# Altium schematic symbol library jlcpcb_2025_04_capacitors_extended_0402.schlib: 3594 symbols (part 4 of 20) (continued)
## AC0402CRNPO9BN1R5
designator C?  Capacitance: 1.5pF  (hidden comment: *)
Capacitor, Ceramic (MLCC), 1.5pF, 50V, NP0, SMD 0402; Manufacturer: YAGEO; Manufacturer Part Number: AC0402CRNPO9BN1R5; Package Size: 0402; JLCPCB Basic Part: No; JLCPCB Part Number: C726105; Supplier 1: LCSC; Category: Capacitors - MLCC; Supplier Part Number 1: C726105; Voltage Rating: 50V; Temperature Coefficient: NP0; RoHS: Yes; ComponentLink1Description: Datasheet; ComponentLink1URL: https://wmsc.lcsc.com/wmsc/upload/file/pdf/v2/lcsc/2010041434_YAGEO-AC0402CRNPO9BN1R5_C726105.pdf; ComponentLink2Description: JLCPCB Part URL; ComponentLink2URL: https://jlcpcb.com/partdetail/C726105; ComponentLink3Description: LCSC Part URL; ComponentLink3URL: https://lcsc.com/product-detail/Multilayer-Ceramic-Capacitors-MLCC---SMD-SMT_YAGEO-YAGEO-AC0402CRNPO9BN1R5_C726105.html
footprint CAP-0402 (0402 (1005M) Capacitor)
pins: 1, 2

## AC0402CRNPO9BN1R8
designator C?  Capacitance: 1.8pF  (hidden comment: *)
Capacitor, Ceramic (MLCC), 1.8pF, 50V, NP0, SMD 0402; Manufacturer: YAGEO; Manufacturer Part Number: AC0402CRNPO9BN1R8; Package Size: 0402; JLCPCB Basic Part: No; JLCPCB Part Number: C723500; Supplier 1: LCSC; Category: Capacitors - MLCC; Supplier Part Number 1: C723500; Voltage Rating: 50V; Temperature Coefficient: NP0; RoHS: Yes; ComponentLink1Description: Datasheet; ComponentLink1URL: https://wmsc.lcsc.com/wmsc/upload/file/pdf/v2/lcsc/2008171812_YAGEO-AC0402CRNPO9BN1R8_C723500.pdf; ComponentLink2Description: JLCPCB Part URL; ComponentLink2URL: https://jlcpcb.com/partdetail/C723500; ComponentLink3Description: LCSC Part URL; ComponentLink3URL: https://lcsc.com/product-detail/Multilayer-Ceramic-Capacitors-MLCC---SMD-SMT_YAGEO-YAGEO-AC0402CRNPO9BN1R8_C723500.html
footprint CAP-0402 (0402 (1005M) Capacitor)
pins: 1, 2

## AC0402CRNPO9BN2R0
designator C?  Capacitance: 2pF  (hidden comment: *)
Capacitor, Ceramic (MLCC), 2pF, 50V, NP0, SMD 0402; Manufacturer: YAGEO; Manufacturer Part Number: AC0402CRNPO9BN2R0; Package Size: 0402; JLCPCB Basic Part: No; JLCPCB Part Number: C726106; Supplier 1: LCSC; Category: Capacitors - MLCC; Supplier Part Number 1: C726106; Voltage Rating: 50V; Temperature Coefficient: NP0; RoHS: Yes; ComponentLink1Description: Datasheet; ComponentLink1URL: https://wmsc.lcsc.com/wmsc/upload/file/pdf/v2/lcsc/2010041434_YAGEO-AC0402CRNPO9BN2R0_C726106.pdf; ComponentLink2Description: JLCPCB Part URL; ComponentLink2URL: https://jlcpcb.com/partdetail/C726106; ComponentLink3Description: LCSC Part URL; ComponentLink3URL: https://lcsc.com/product-detail/Multilayer-Ceramic-Capacitors-MLCC---SMD-SMT_YAGEO-YAGEO-AC0402CRNPO9BN2R0_C726106.html
footprint CAP-0402 (0402 (1005M) Capacitor)
pins: 1, 2

## AC0402CRNPO9BN2R2
designator C?  Capacitance: 2.2pF  (hidden comment: *)
Capacitor, Ceramic (MLCC), 2.2pF, 50V, NP0, SMD 0402; Manufacturer: YAGEO; Manufacturer Part Number: AC0402CRNPO9BN2R2; Package Size: 0402; JLCPCB Basic Part: No; JLCPCB Part Number: C726107; Supplier 1: LCSC; Category: Capacitors - MLCC; Supplier Part Number 1: C726107; Voltage Rating: 50V; Temperature Coefficient: NP0; RoHS: Yes; ComponentLink1Description: Datasheet; ComponentLink1URL: https://wmsc.lcsc.com/wmsc/upload/file/pdf/v2/lcsc/2011221205_YAGEO-AC0402CRNPO9BN2R2_C726107.pdf; ComponentLink2Description: JLCPCB Part URL; ComponentLink2URL: https://jlcpcb.com/partdetail/C726107; ComponentLink3Description: LCSC Part URL; ComponentLink3URL: https://lcsc.com/product-detail/Multilayer-Ceramic-Capacitors-MLCC---SMD-SMT_YAGEO-YAGEO-AC0402CRNPO9BN2R2_C726107.html
footprint CAP-0402 (0402 (1005M) Capacitor)
pins: 1, 2

## AC0402CRNPO9BN2R7
designator C?  Capacitance: 2.7pF  (hidden comment: *)
Capacitor, Ceramic (MLCC), 2.7pF, 50V, NP0, SMD 0402; Manufacturer: YAGEO; Manufacturer Part Number: AC0402CRNPO9BN2R7; Package Size: 0402; JLCPCB Basic Part: No; JLCPCB Part Number: C726108; Supplier 1: LCSC; Category: Capacitors - MLCC; Supplier Part Number 1: C726108; Voltage Rating: 50V; Temperature Coefficient: NP0; RoHS: Yes; ComponentLink1Description: Datasheet; ComponentLink1URL: https://wmsc.lcsc.com/wmsc/upload/file/pdf/v2/lcsc/2009191609_YAGEO-AC0402CRNPO9BN2R7_C726108.pdf; ComponentLink2Description: JLCPCB Part URL; ComponentLink2URL: https://jlcpcb.com/partdetail/C726108; ComponentLink3Description: LCSC Part URL; ComponentLink3URL: https://lcsc.com/product-detail/Multilayer-Ceramic-Capacitors-MLCC---SMD-SMT_YAGEO-YAGEO-AC0402CRNPO9BN2R7_C726108.html
footprint CAP-0402 (0402 (1005M) Capacitor)
pins: 1, 2

## AC0402CRNPO9BN3R0
designator C?  Capacitance: 3pF  (hidden comment: *)
Capacitor, Ceramic (MLCC), 3pF, 50V, NP0, SMD 0402; Manufacturer: YAGEO; Manufacturer Part Number: AC0402CRNPO9BN3R0; Package Size: 0402; JLCPCB Basic Part: No; JLCPCB Part Number: C726109; Supplier 1: LCSC; Category: Capacitors - MLCC; Supplier Part Number 1: C726109; Voltage Rating: 50V; Temperature Coefficient: NP0; RoHS: Yes; ComponentLink1Description: Datasheet; ComponentLink1URL: https://wmsc.lcsc.com/wmsc/upload/file/pdf/v2/lcsc/2010311304_YAGEO-AC0402CRNPO9BN3R0_C726109.pdf; ComponentLink2Description: JLCPCB Part URL; ComponentLink2URL: https://jlcpcb.com/partdetail/C726109; ComponentLink3Description: LCSC Part URL; ComponentLink3URL: https://lcsc.com/product-detail/Multilayer-Ceramic-Capacitors-MLCC---SMD-SMT_YAGEO-YAGEO-AC0402CRNPO9BN3R0_C726109.html
footprint CAP-0402 (0402 (1005M) Capacitor)
pins: 1, 2

## AC0402CRNPO9BN3R3
designator C?  Capacitance: 3.3pF  (hidden comment: *)
Capacitor, Ceramic (MLCC), 3.3pF, 50V, NP0, SMD 0402; Manufacturer: YAGEO; Manufacturer Part Number: AC0402CRNPO9BN3R3; Package Size: 0402; JLCPCB Basic Part: No; JLCPCB Part Number: C326841; Supplier 1: LCSC; Category: Capacitors - MLCC; Supplier Part Number 1: C326841; Voltage Rating: 50V; Temperature Coefficient: NP0; RoHS: Yes; ComponentLink1Description: Datasheet; ComponentLink1URL: https://wmsc.lcsc.com/wmsc/upload/file/pdf/v2/lcsc/1811151648_YAGEO-AC0402CRNPO9BN3R3_C326841.pdf; ComponentLink2Description: JLCPCB Part URL; ComponentLink2URL: https://jlcpcb.com/partdetail/C326841; ComponentLink3Description: LCSC Part URL; ComponentLink3URL: https://lcsc.com/product-detail/Multilayer-Ceramic-Capacitors-MLCC---SMD-SMT_YAGEO-YAGEO-AC0402CRNPO9BN3R3_C326841.html
footprint CAP-0402 (0402 (1005M) Capacitor)
pins: 1, 2

## AC0402CRNPO9BN3R9
designator C?  Capacitance: 3.9pF  (hidden comment: *)
Capacitor, Ceramic (MLCC), 3.9pF, 50V, NP0, SMD 0402; Manufacturer: YAGEO; Manufacturer Part Number: AC0402CRNPO9BN3R9; Package Size: 0402; JLCPCB Basic Part: No; JLCPCB Part Number: C726110; Supplier 1: LCSC; Category: Capacitors - MLCC; Supplier Part Number 1: C726110; Voltage Rating: 50V; Temperature Coefficient: NP0; RoHS: Yes; ComponentLink1Description: Datasheet; ComponentLink1URL: https://wmsc.lcsc.com/wmsc/upload/file/pdf/v2/lcsc/2010041434_YAGEO-AC0402CRNPO9BN3R9_C726110.pdf; ComponentLink2Description: JLCPCB Part URL; ComponentLink2URL: https://jlcpcb.com/partdetail/C726110; ComponentLink3Description: LCSC Part URL; ComponentLink3URL: https://lcsc.com/product-detail/Multilayer-Ceramic-Capacitors-MLCC---SMD-SMT_YAGEO-YAGEO-AC0402CRNPO9BN3R9_C726110.html
footprint CAP-0402 (0402 (1005M) Capacitor)
pins: 1, 2

## AC0402CRNPO9BN4R0
designator C?  Capacitance: 4pF  (hidden comment: *)
Capacitor, Ceramic (MLCC), 4pF, 50V, NP0, SMD 0402; Manufacturer: YAGEO; Manufacturer Part Number: AC0402CRNPO9BN4R0; Package Size: 0402; JLCPCB Basic Part: No; JLCPCB Part Number: C726111; Supplier 1: LCSC; Category: Capacitors - MLCC; Supplier Part Number 1: C726111; Voltage Rating: 50V; Temperature Coefficient: NP0; RoHS: Yes; ComponentLink1Description: Datasheet; ComponentLink1URL: https://wmsc.lcsc.com/wmsc/upload/file/pdf/v2/lcsc/2203261130_YAGEO-AC0402CRNPO9BN4R0_C726111.pdf; ComponentLink2Description: JLCPCB Part URL; ComponentLink2URL: https://jlcpcb.com/partdetail/C726111; ComponentLink3Description: LCSC Part URL; ComponentLink3URL: https://lcsc.com/product-detail/Multilayer-Ceramic-Capacitors-MLCC---SMD-SMT_YAGEO-YAGEO-AC0402CRNPO9BN4R0_C726111.html
footprint CAP-0402 (0402 (1005M) Capacitor)
pins: 1, 2

## AC0402CRNPO9BN4R7
designator C?  Capacitance: 4.7pF  (hidden comment: *)
Capacitor, Ceramic (MLCC), 4.7pF, 50V, NP0, SMD 0402; Manufacturer: YAGEO; Manufacturer Part Number: AC0402CRNPO9BN4R7; Package Size: 0402; JLCPCB Basic Part: No; JLCPCB Part Number: C726112; Supplier 1: LCSC; Category: Capacitors - MLCC; Supplier Part Number 1: C726112; Voltage Rating: 50V; Temperature Coefficient: NP0; RoHS: Yes; ComponentLink1Description: Datasheet; ComponentLink1URL: https://wmsc.lcsc.com/wmsc/upload/file/pdf/v2/lcsc/2009181006_YAGEO-AC0402CRNPO9BN4R7_C726112.pdf; ComponentLink2Description: JLCPCB Part URL; ComponentLink2URL: https://jlcpcb.com/partdetail/C726112; ComponentLink3Description: LCSC Part URL; ComponentLink3URL: https://lcsc.com/product-detail/Multilayer-Ceramic-Capacitors-MLCC---SMD-SMT_YAGEO-YAGEO-AC0402CRNPO9BN4R7_C726112.html
footprint CAP-0402 (0402 (1005M) Capacitor)
pins: 1, 2

## AC0402CRNPO9BN5R0
designator C?  Capacitance: 5pF  (hidden comment: *)
Capacitor, Ceramic (MLCC), 5pF, 50V, NP0, SMD 0402; Manufacturer: YAGEO; Manufacturer Part Number: AC0402CRNPO9BN5R0; Package Size: 0402; JLCPCB Basic Part: No; JLCPCB Part Number: C726113; Supplier 1: LCSC; Category: Capacitors - MLCC; Supplier Part Number 1: C726113; Voltage Rating: 50V; Temperature Coefficient: NP0; RoHS: Yes; ComponentLink1Description: Datasheet; ComponentLink1URL: https://wmsc.lcsc.com/wmsc/upload/file/pdf/v2/lcsc/2009181006_YAGEO-AC0402CRNPO9BN5R0_C726113.pdf; ComponentLink2Description: JLCPCB Part URL; ComponentLink2URL: https://jlcpcb.com/partdetail/C726113; ComponentLink3Description: LCSC Part URL; ComponentLink3URL: https://lcsc.com/product-detail/Multilayer-Ceramic-Capacitors-MLCC---SMD-SMT_YAGEO-YAGEO-AC0402CRNPO9BN5R0_C726113.html
footprint CAP-0402 (0402 (1005M) Capacitor)
pins: 1, 2

## AC0402CRNPO9BN5R6
designator C?  Capacitance: 5.6pF  (hidden comment: *)
Capacitor, Ceramic (MLCC), 5.6pF, 50V, NP0, SMD 0402; Manufacturer: YAGEO; Manufacturer Part Number: AC0402CRNPO9BN5R6; Package Size: 0402; JLCPCB Basic Part: No; JLCPCB Part Number: C2168879; Supplier 1: LCSC; Category: Capacitors - MLCC; Supplier Part Number 1: C2168879; Voltage Rating: 50V; Temperature Coefficient: NP0; RoHS: Yes; ComponentLink1Description: Datasheet; ComponentLink1URL: https://wmsc.lcsc.com/wmsc/upload/file/pdf/v2/lcsc/2202040330_YAGEO-AC0402CRNPO9BN5R6_C2168879.pdf; ComponentLink2Description: JLCPCB Part URL; ComponentLink2URL: https://jlcpcb.com/partdetail/C2168879; ComponentLink3Description: LCSC Part URL; ComponentLink3URL: https://lcsc.com/product-detail/Multilayer-Ceramic-Capacitors-MLCC---SMD-SMT_YAGEO-YAGEO-AC0402CRNPO9BN5R6_C2168879.html
footprint CAP-0402 (0402 (1005M) Capacitor)
pins: 1, 2

## AC0402CRNPO9BN6R0
designator C?  Capacitance: 6pF  (hidden comment: *)
Capacitor, Ceramic (MLCC), 6pF, 50V, NP0, SMD 0402; Manufacturer: YAGEO; Manufacturer Part Number: AC0402CRNPO9BN6R0; Package Size: 0402; JLCPCB Basic Part: No; JLCPCB Part Number: C726114; Supplier 1: LCSC; Category: Capacitors - MLCC; Supplier Part Number 1: C726114; Voltage Rating: 50V; Temperature Coefficient: NP0; RoHS: Yes; ComponentLink1Description: Datasheet; ComponentLink1URL: https://wmsc.lcsc.com/wmsc/upload/file/pdf/v2/lcsc/2010311304_YAGEO-AC0402CRNPO9BN6R0_C726114.pdf; ComponentLink2Description: JLCPCB Part URL; ComponentLink2URL: https://jlcpcb.com/partdetail/C726114; ComponentLink3Description: LCSC Part URL; ComponentLink3URL: https://lcsc.com/product-detail/Multilayer-Ceramic-Capacitors-MLCC---SMD-SMT_YAGEO-YAGEO-AC0402CRNPO9BN6R0_C726114.html
footprint CAP-0402 (0402 (1005M) Capacitor)
pins: 1, 2

## AC0402CRNPO9BN6R8
designator C?  Capacitance: 6.8pF  (hidden comment: *)
Capacitor, Ceramic (MLCC), 6.8pF, 50V, NP0, SMD 0402; Manufacturer: YAGEO; Manufacturer Part Number: AC0402CRNPO9BN6R8; Package Size: 0402; JLCPCB Basic Part: No; JLCPCB Part Number: C726115; Supplier 1: LCSC; Category: Capacitors - MLCC; Supplier Part Number 1: C726115; Voltage Rating: 50V; Temperature Coefficient: NP0; RoHS: Yes; ComponentLink1Description: Datasheet; ComponentLink1URL: https://wmsc.lcsc.com/wmsc/upload/file/pdf/v2/lcsc/2009181006_YAGEO-AC0402CRNPO9BN6R8_C726115.pdf; ComponentLink2Description: JLCPCB Part URL; ComponentLink2URL: https://jlcpcb.com/partdetail/C726115; ComponentLink3Description: LCSC Part URL; ComponentLink3URL: https://lcsc.com/product-detail/Multilayer-Ceramic-Capacitors-MLCC---SMD-SMT_YAGEO-YAGEO-AC0402CRNPO9BN6R8_C726115.html
footprint CAP-0402 (0402 (1005M) Capacitor)
pins: 1, 2

## AC0402CRNPO9BN7R0
designator C?  Capacitance: 7pF  (hidden comment: *)
Capacitor, Ceramic (MLCC), 7pF, 50V, NP0, SMD 0402; Manufacturer: YAGEO; Manufacturer Part Number: AC0402CRNPO9BN7R0; Package Size: 0402; JLCPCB Basic Part: No; JLCPCB Part Number: C2187952; Supplier 1: LCSC; Category: Capacitors - MLCC; Supplier Part Number 1: C2187952; Voltage Rating: 50V; Temperature Coefficient: NP0; RoHS: Yes; ComponentLink1Description: Datasheet; ComponentLink1URL: https://wmsc.lcsc.com/wmsc/upload/file/pdf/v2/lcsc/2202041730_YAGEO-AC0402CRNPO9BN7R0_C2187952.pdf; ComponentLink2Description: JLCPCB Part URL; ComponentLink2URL: https://jlcpcb.com/partdetail/C2187952; ComponentLink3Description: LCSC Part URL; ComponentLink3URL: https://lcsc.com/product-detail/Multilayer-Ceramic-Capacitors-MLCC---SMD-SMT_YAGEO-YAGEO-AC0402CRNPO9BN7R0_C2187952.html
footprint CAP-0402 (0402 (1005M) Capacitor)
pins: 1, 2

## AC0402CRNPO9BN8R0
designator C?  Capacitance: 8pF  (hidden comment: *)
Capacitor, Ceramic (MLCC), 8pF, 50V, NP0, SMD 0402; Manufacturer: YAGEO; Manufacturer Part Number: AC0402CRNPO9BN8R0; Package Size: 0402; JLCPCB Basic Part: No; JLCPCB Part Number: C962144; Supplier 1: LCSC; Category: Capacitors - MLCC; Supplier Part Number 1: C962144; Voltage Rating: 50V; Temperature Coefficient: NP0; RoHS: Yes; ComponentLink1Description: Datasheet; ComponentLink1URL: https://wmsc.lcsc.com/wmsc/upload/file/pdf/v2/lcsc/2011291034_YAGEO-AC0402CRNPO9BN8R0_C962144.pdf; ComponentLink2Description: JLCPCB Part URL; ComponentLink2URL: https://jlcpcb.com/partdetail/C962144; ComponentLink3Description: LCSC Part URL; ComponentLink3URL: https://lcsc.com/product-detail/Multilayer-Ceramic-Capacitors-MLCC---SMD-SMT_YAGEO-YAGEO-AC0402CRNPO9BN8R0_C962144.html
footprint CAP-0402 (0402 (1005M) Capacitor)
pins: 1, 2

## AC0402CRNPO9BN8R2
designator C?  Capacitance: 8.2pF  (hidden comment: *)
Capacitor, Ceramic (MLCC), 8.2pF, 50V, NP0, SMD 0402; Manufacturer: YAGEO; Manufacturer Part Number: AC0402CRNPO9BN8R2; Package Size: 0402; JLCPCB Basic Part: No; JLCPCB Part Number: C726117; Supplier 1: LCSC; Category: Capacitors - MLCC; Supplier Part Number 1: C726117; Voltage Rating: 50V; Temperature Coefficient: NP0; RoHS: Yes; ComponentLink1Description: Datasheet; ComponentLink1URL: https://wmsc.lcsc.com/wmsc/upload/file/pdf/v2/lcsc/2010041434_YAGEO-AC0402CRNPO9BN8R2_C726117.pdf; ComponentLink2Description: JLCPCB Part URL; ComponentLink2URL: https://jlcpcb.com/partdetail/C726117; ComponentLink3Description: LCSC Part URL; ComponentLink3URL: https://lcsc.com/product-detail/Multilayer-Ceramic-Capacitors-MLCC---SMD-SMT_YAGEO-YAGEO-AC0402CRNPO9BN8R2_C726117.html
footprint CAP-0402 (0402 (1005M) Capacitor)
pins: 1, 2

## AC0402CRNPO9BN9R0
designator C?  Capacitance: 9pF  (hidden comment: *)
Capacitor, Ceramic (MLCC), 9pF, 50V, NP0, SMD 0402; Manufacturer: YAGEO; Manufacturer Part Number: AC0402CRNPO9BN9R0; Package Size: 0402; JLCPCB Basic Part: No; JLCPCB Part Number: C326843; Supplier 1: LCSC; Category: Capacitors - MLCC; Supplier Part Number 1: C326843; Voltage Rating: 50V; Temperature Coefficient: NP0; RoHS: Yes; ComponentLink1Description: Datasheet; ComponentLink1URL: https://wmsc.lcsc.com/wmsc/upload/file/pdf/v2/lcsc/1811141353_YAGEO-AC0402CRNPO9BN9R0_C326843.pdf; ComponentLink2Description: JLCPCB Part URL; ComponentLink2URL: https://jlcpcb.com/partdetail/C326843; ComponentLink3Description: LCSC Part URL; ComponentLink3URL: https://lcsc.com/product-detail/Multilayer-Ceramic-Capacitors-MLCC---SMD-SMT_YAGEO-YAGEO-AC0402CRNPO9BN9R0_C326843.html
footprint CAP-0402 (0402 (1005M) Capacitor)
pins: 1, 2

## AC0402DRNPO9BN6R8
designator C?  Capacitance: 6.8pF  (hidden comment: *)
Capacitor, Ceramic (MLCC), 6.8pF, 50V, NP0, SMD 0402; Manufacturer: YAGEO; Manufacturer Part Number: AC0402DRNPO9BN6R8; Package Size: 0402; JLCPCB Basic Part: No; JLCPCB Part Number: C2180791; Supplier 1: LCSC; Category: Capacitors - MLCC; Supplier Part Number 1: C2180791; Voltage Rating: 50V; Temperature Coefficient: NP0; RoHS: Yes; ComponentLink1Description: Datasheet; ComponentLink1URL: https://wmsc.lcsc.com/wmsc/upload/file/pdf/v2/lcsc/2202041130_YAGEO-AC0402DRNPO9BN6R8_C2180791.pdf; ComponentLink2Description: JLCPCB Part URL; ComponentLink2URL: https://jlcpcb.com/partdetail/C2180791; ComponentLink3Description: LCSC Part URL; ComponentLink3URL: https://lcsc.com/product-detail/Multilayer-Ceramic-Capacitors-MLCC---SMD-SMT_YAGEO-YAGEO-AC0402DRNPO9BN6R8_C2180791.html
footprint CAP-0402 (0402 (1005M) Capacitor)
pins: 1, 2

## AC0402DRNPO9BN8R0
designator C?  Capacitance: 8pF  (hidden comment: *)
Capacitor, Ceramic (MLCC), 8pF, 50V, NP0, SMD 0402; Manufacturer: YAGEO; Manufacturer Part Number: AC0402DRNPO9BN8R0; Package Size: 0402; JLCPCB Basic Part: No; JLCPCB Part Number: C705009; Supplier 1: LCSC; Category: Capacitors - MLCC; Supplier Part Number 1: C705009; Voltage Rating: 50V; Temperature Coefficient: NP0; RoHS: Yes; ComponentLink1Description: Datasheet; ComponentLink1URL: https://wmsc.lcsc.com/wmsc/upload/file/pdf/v2/lcsc/2304140030_YAGEO-AC0402DRNPO9BN8R0_C705009.pdf; ComponentLink2Description: JLCPCB Part URL; ComponentLink2URL: https://jlcpcb.com/partdetail/C705009; ComponentLink3Description: LCSC Part URL; ComponentLink3URL: https://lcsc.com/product-detail/Multilayer-Ceramic-Capacitors-MLCC---SMD-SMT_YAGEO-YAGEO-AC0402DRNPO9BN8R0_C705009.html
footprint CAP-0402 (0402 (1005M) Capacitor)
pins: 1, 2

## AC0402FRNPO9BN100
designator C?  Capacitance: 10pF  (hidden comment: *)
Capacitor, Ceramic (MLCC), 10pF, ±1%, 50V, C0G, ±1%, SMD 0402; Manufacturer: YAGEO; Manufacturer Part Number: AC0402FRNPO9BN100; Package Size: 0402; JLCPCB Basic Part: No; JLCPCB Part Number: C3864989; Supplier 1: LCSC; Category: Capacitors - MLCC; Supplier Part Number 1: C3864989; Tolerance: ±1%; Voltage Rating: 50V; Temperature Coefficient: C0G; RoHS: Yes; ComponentLink1Description: Datasheet; ComponentLink1URL: https://wmsc.lcsc.com/wmsc/upload/file/pdf/v2/lcsc/2401221317_YAGEO-AC0402FRNPO9BN100_C3864989.pdf; ComponentLink2Description: JLCPCB Part URL; ComponentLink2URL: https://jlcpcb.com/partdetail/C3864989; ComponentLink3Description: LCSC Part URL; ComponentLink3URL: https://lcsc.com/product-detail/Multilayer-Ceramic-Capacitors-MLCC---SMD-SMT_YAGEO-YAGEO-AC0402FRNPO9BN100_C3864989.html
footprint CAP-0402 (0402 (1005M) Capacitor)
pins: 1, 2

## AC0402FRNPO9BN120
designator C?  Capacitance: 12pF  (hidden comment: *)
Capacitor, Ceramic (MLCC), 12pF, ±1%, 50V, C0G, ±1%, SMD 0402; Manufacturer: YAGEO; Manufacturer Part Number: AC0402FRNPO9BN120; Package Size: 0402; JLCPCB Basic Part: No; JLCPCB Part Number: C3857072; Supplier 1: LCSC; Category: Capacitors - MLCC; Supplier Part Number 1: C3857072; Tolerance: ±1%; Voltage Rating: 50V; Temperature Coefficient: C0G; RoHS: Yes; ComponentLink1Description: Datasheet; ComponentLink1URL: https://wmsc.lcsc.com/wmsc/upload/file/pdf/v2/lcsc/2311211113_YAGEO-AC0402FRNPO9BN120_C3857072.pdf; ComponentLink2Description: JLCPCB Part URL; ComponentLink2URL: https://jlcpcb.com/partdetail/C3857072; ComponentLink3Description: LCSC Part URL; ComponentLink3URL: https://lcsc.com/product-detail/Multilayer-Ceramic-Capacitors-MLCC---SMD-SMT_YAGEO-YAGEO-AC0402FRNPO9BN120_C3857072.html
footprint CAP-0402 (0402 (1005M) Capacitor)
pins: 1, 2

## AC0402FRNPO9BN470
designator C?  Capacitance: 47pF  (hidden comment: *)
Capacitor, Ceramic (MLCC), 47pF, ±1%, 50V, NP0, ±1%, SMD 0402; Manufacturer: YAGEO; Manufacturer Part Number: AC0402FRNPO9BN470; Package Size: 0402; JLCPCB Basic Part: No; JLCPCB Part Number: C1852944; Supplier 1: LCSC; Category: Capacitors - MLCC; Supplier Part Number 1: C1852944; Tolerance: ±1%; Voltage Rating: 50V; Temperature Coefficient: NP0; RoHS: Yes; ComponentLink1Description: Datasheet; ComponentLink1URL: https://wmsc.lcsc.com/wmsc/upload/file/pdf/v2/lcsc/2202151130_YAGEO-AC0402FRNPO9BN470_C1852944.pdf; ComponentLink2Description: JLCPCB Part URL; ComponentLink2URL: https://jlcpcb.com/partdetail/C1852944; ComponentLink3Description: LCSC Part URL; ComponentLink3URL: https://lcsc.com/product-detail/Multilayer-Ceramic-Capacitors-MLCC---SMD-SMT_YAGEO-YAGEO-AC0402FRNPO9BN470_C1852944.html
footprint CAP-0402 (0402 (1005M) Capacitor)
pins: 1, 2

## AC0402JRNPO9BN100
designator C?  Capacitance: 10pF  (hidden comment: *)
Capacitor, Ceramic (MLCC), 10pF, ±5%, 50V, NP0, ±5%, SMD 0402; Manufacturer: YAGEO; Manufacturer Part Number: AC0402JRNPO9BN100; Package Size: 0402; JLCPCB Basic Part: No; JLCPCB Part Number: C309125; Supplier 1: LCSC; Category: Capacitors - MLCC; Supplier Part Number 1: C309125; Tolerance: ±5%; Voltage Rating: 50V; Temperature Coefficient: NP0; RoHS: Yes; ComponentLink1Description: Datasheet; ComponentLink1URL: https://wmsc.lcsc.com/wmsc/upload/file/pdf/v2/lcsc/2304140030_YAGEO-AC0402JRNPO9BN100_C309125.pdf; ComponentLink2Description: JLCPCB Part URL; ComponentLink2URL: https://jlcpcb.com/partdetail/C309125; ComponentLink3Description: LCSC Part URL; ComponentLink3URL: https://lcsc.com/product-detail/Multilayer-Ceramic-Capacitors-MLCC---SMD-SMT_YAGEO-YAGEO-AC0402JRNPO9BN100_C309125.html
footprint CAP-0402 (0402 (1005M) Capacitor)
pins: 1, 2

## AC0402JRNPO9BN101
designator C?  Capacitance: 100pF  (hidden comment: *)
Capacitor, Ceramic (MLCC), 100pF, ±5%, 50V, NP0, ±5%, SMD 0402; Manufacturer: YAGEO; Manufacturer Part Number: AC0402JRNPO9BN101; Package Size: 0402; JLCPCB Basic Part: No; JLCPCB Part Number: C277520; Supplier 1: LCSC; Category: Capacitors - MLCC; Supplier Part Number 1: C277520; Tolerance: ±5%; Voltage Rating: 50V; Temperature Coefficient: NP0; RoHS: Yes; ComponentLink1Description: Datasheet; ComponentLink1URL: https://wmsc.lcsc.com/wmsc/upload/file/pdf/v2/lcsc/2304140030_YAGEO-AC0402JRNPO9BN101_C277520.pdf; ComponentLink2Description: JLCPCB Part URL; ComponentLink2URL: https://jlcpcb.com/partdetail/C277520; ComponentLink3Description: LCSC Part URL; ComponentLink3URL: https://lcsc.com/product-detail/Multilayer-Ceramic-Capacitors-MLCC---SMD-SMT_YAGEO-YAGEO-AC0402JRNPO9BN101_C277520.html
footprint CAP-0402 (0402 (1005M) Capacitor)
pins: 1, 2

## AC0402JRNPO9BN120
designator C?  Capacitance: 12pF  (hidden comment: *)
Capacitor, Ceramic (MLCC), 12pF, ±5%, 50V, NP0, ±5%, SMD 0402; Manufacturer: YAGEO; Manufacturer Part Number: AC0402JRNPO9BN120; Package Size: 0402; JLCPCB Basic Part: No; JLCPCB Part Number: C726119; Supplier 1: LCSC; Category: Capacitors - MLCC; Supplier Part Number 1: C726119; Tolerance: ±5%; Voltage Rating: 50V; Temperature Coefficient: NP0; RoHS: Yes; ComponentLink1Description: Datasheet; ComponentLink1URL: https://wmsc.lcsc.com/wmsc/upload/file/pdf/v2/lcsc/2009181006_YAGEO-AC0402JRNPO9BN120_C726119.pdf; ComponentLink2Description: JLCPCB Part URL; ComponentLink2URL: https://jlcpcb.com/partdetail/C726119; ComponentLink3Description: LCSC Part URL; ComponentLink3URL: https://lcsc.com/product-detail/Multilayer-Ceramic-Capacitors-MLCC---SMD-SMT_YAGEO-YAGEO-AC0402JRNPO9BN120_C726119.html
footprint CAP-0402 (0402 (1005M) Capacitor)
pins: 1, 2

## AC0402JRNPO9BN121
designator C?  Capacitance: 120pF  (hidden comment: *)
Capacitor, Ceramic (MLCC), 120pF, ±5%, 50V, NP0, ±5%, SMD 0402; Manufacturer: YAGEO; Manufacturer Part Number: AC0402JRNPO9BN121; Package Size: 0402; JLCPCB Basic Part: No; JLCPCB Part Number: C726120; Supplier 1: LCSC; Category: Capacitors - MLCC; Supplier Part Number 1: C726120; Tolerance: ±5%; Voltage Rating: 50V; Temperature Coefficient: NP0; RoHS: Yes; ComponentLink1Description: Datasheet; ComponentLink1URL: https://wmsc.lcsc.com/wmsc/upload/file/pdf/v2/lcsc/2009181006_YAGEO-AC0402JRNPO9BN121_C726120.pdf; ComponentLink2Description: JLCPCB Part URL; ComponentLink2URL: https://jlcpcb.com/partdetail/C726120; ComponentLink3Description: LCSC Part URL; ComponentLink3URL: https://lcsc.com/product-detail/Multilayer-Ceramic-Capacitors-MLCC---SMD-SMT_YAGEO-YAGEO-AC0402JRNPO9BN121_C726120.html
footprint CAP-0402 (0402 (1005M) Capacitor)
pins: 1, 2

## AC0402JRNPO9BN130
designator C?  Capacitance: 13pF  (hidden comment: *)
Capacitor, Ceramic (MLCC), 13pF, ±5%, 50V, NP0, ±5%, SMD 0402; Manufacturer: YAGEO; Manufacturer Part Number: AC0402JRNPO9BN130; Package Size: 0402; JLCPCB Basic Part: No; JLCPCB Part Number: C326790; Supplier 1: LCSC; Category: Capacitors - MLCC; Supplier Part Number 1: C326790; Tolerance: ±5%; Voltage Rating: 50V; Temperature Coefficient: NP0; RoHS: Yes; ComponentLink1Description: Datasheet; ComponentLink1URL: https://wmsc.lcsc.com/wmsc/upload/file/pdf/v2/lcsc/1811141225_YAGEO-AC0402JRNPO9BN130_C326790.pdf; ComponentLink2Description: JLCPCB Part URL; ComponentLink2URL: https://jlcpcb.com/partdetail/C326790; ComponentLink3Description: LCSC Part URL; ComponentLink3URL: https://lcsc.com/product-detail/Multilayer-Ceramic-Capacitors-MLCC---SMD-SMT_YAGEO-YAGEO-AC0402JRNPO9BN130_C326790.html
footprint CAP-0402 (0402 (1005M) Capacitor)
pins: 1, 2

## AC0402JRNPO9BN150
designator C?  Capacitance: 15pF  (hidden comment: *)
Capacitor, Ceramic (MLCC), 15pF, ±5%, 50V, NP0, ±5%, SMD 0402; Manufacturer: YAGEO; Manufacturer Part Number: AC0402JRNPO9BN150; Package Size: 0402; JLCPCB Basic Part: No; JLCPCB Part Number: C513575; Supplier 1: LCSC; Category: Capacitors - MLCC; Supplier Part Number 1: C513575; Tolerance: ±5%; Voltage Rating: 50V; Temperature Coefficient: NP0; RoHS: Yes; ComponentLink1Description: Datasheet; ComponentLink1URL: https://wmsc.lcsc.com/wmsc/upload/file/pdf/v2/lcsc/2204021130_YAGEO-AC0402JRNPO9BN150_C513575.pdf; ComponentLink2Description: JLCPCB Part URL; ComponentLink2URL: https://jlcpcb.com/partdetail/C513575; ComponentLink3Description: LCSC Part URL; ComponentLink3URL: https://lcsc.com/product-detail/Multilayer-Ceramic-Capacitors-MLCC---SMD-SMT_YAGEO-YAGEO-AC0402JRNPO9BN150_C513575.html
footprint CAP-0402 (0402 (1005M) Capacitor)
pins: 1, 2

## AC0402JRNPO9BN151
designator C?  Capacitance: 150pF  (hidden comment: *)
Capacitor, Ceramic (MLCC), 150pF, ±5%, 50V, NP0, ±5%, SMD 0402; Manufacturer: YAGEO; Manufacturer Part Number: AC0402JRNPO9BN151; Package Size: 0402; JLCPCB Basic Part: No; JLCPCB Part Number: C726121; Supplier 1: LCSC; Category: Capacitors - MLCC; Supplier Part Number 1: C726121; Tolerance: ±5%; Voltage Rating: 50V; Temperature Coefficient: NP0; RoHS: Yes; ComponentLink1Description: Datasheet; ComponentLink1URL: https://wmsc.lcsc.com/wmsc/upload/file/pdf/v2/lcsc/2009191609_YAGEO-AC0402JRNPO9BN151_C726121.pdf; ComponentLink2Description: JLCPCB Part URL; ComponentLink2URL: https://jlcpcb.com/partdetail/C726121; ComponentLink3Description: LCSC Part URL; ComponentLink3URL: https://lcsc.com/product-detail/Multilayer-Ceramic-Capacitors-MLCC---SMD-SMT_YAGEO-YAGEO-AC0402JRNPO9BN151_C726121.html
footprint CAP-0402 (0402 (1005M) Capacitor)
pins: 1, 2

## AC0402JRNPO9BN180
designator C?  Capacitance: 18pF  (hidden comment: *)
Capacitor, Ceramic (MLCC), 18pF, ±5%, 50V, NP0, ±5%, SMD 0402; Manufacturer: YAGEO; Manufacturer Part Number: AC0402JRNPO9BN180; Package Size: 0402; JLCPCB Basic Part: No; JLCPCB Part Number: C726122; Supplier 1: LCSC; Category: Capacitors - MLCC; Supplier Part Number 1: C726122; Tolerance: ±5%; Voltage Rating: 50V; Temperature Coefficient: NP0; RoHS: Yes; ComponentLink1Description: Datasheet; ComponentLink1URL: https://wmsc.lcsc.com/wmsc/upload/file/pdf/v2/lcsc/2009191609_YAGEO-AC0402JRNPO9BN180_C726122.pdf; ComponentLink2Description: JLCPCB Part URL; ComponentLink2URL: https://jlcpcb.com/partdetail/C726122; ComponentLink3Description: LCSC Part URL; ComponentLink3URL: https://lcsc.com/product-detail/Multilayer-Ceramic-Capacitors-MLCC---SMD-SMT_YAGEO-YAGEO-AC0402JRNPO9BN180_C726122.html
footprint CAP-0402 (0402 (1005M) Capacitor)
pins: 1, 2

## AC0402JRNPO9BN181
designator C?  Capacitance: 180pF  (hidden comment: *)
Capacitor, Ceramic (MLCC), 180pF, ±5%, 50V, NP0, ±5%, SMD 0402; Manufacturer: YAGEO; Manufacturer Part Number: AC0402JRNPO9BN181; Package Size: 0402; JLCPCB Basic Part: No; JLCPCB Part Number: C726123; Supplier 1: LCSC; Category: Capacitors - MLCC; Supplier Part Number 1: C726123; Tolerance: ±5%; Voltage Rating: 50V; Temperature Coefficient: NP0; RoHS: Yes; ComponentLink1Description: Datasheet; ComponentLink1URL: https://wmsc.lcsc.com/wmsc/upload/file/pdf/v2/lcsc/2011201408_YAGEO-AC0402JRNPO9BN181_C726123.pdf; ComponentLink2Description: JLCPCB Part URL; ComponentLink2URL: https://jlcpcb.com/partdetail/C726123; ComponentLink3Description: LCSC Part URL; ComponentLink3URL: https://lcsc.com/product-detail/Multilayer-Ceramic-Capacitors-MLCC---SMD-SMT_YAGEO-YAGEO-AC0402JRNPO9BN181_C726123.html
footprint CAP-0402 (0402 (1005M) Capacitor)
pins: 1, 2

## AC0402JRNPO9BN200
designator C?  Capacitance: 20pF  (hidden comment: *)
Capacitor, Ceramic (MLCC), 20pF, ±5%, 50V, NP0, ±5%, SMD 0402; Manufacturer: YAGEO; Manufacturer Part Number: AC0402JRNPO9BN200; Package Size: 0402; JLCPCB Basic Part: No; JLCPCB Part Number: C726124; Supplier 1: LCSC; Category: Capacitors - MLCC; Supplier Part Number 1: C726124; Tolerance: ±5%; Voltage Rating: 50V; Temperature Coefficient: NP0; RoHS: Yes; ComponentLink1Description: Datasheet; ComponentLink1URL: https://wmsc.lcsc.com/wmsc/upload/file/pdf/v2/lcsc/2010041434_YAGEO-AC0402JRNPO9BN200_C726124.pdf; ComponentLink2Description: JLCPCB Part URL; ComponentLink2URL: https://jlcpcb.com/partdetail/C726124; ComponentLink3Description: LCSC Part URL; ComponentLink3URL: https://lcsc.com/product-detail/Multilayer-Ceramic-Capacitors-MLCC---SMD-SMT_YAGEO-YAGEO-AC0402JRNPO9BN200_C726124.html
footprint CAP-0402 (0402 (1005M) Capacitor)
pins: 1, 2

## AC0402JRNPO9BN220
designator C?  Capacitance: 22pF  (hidden comment: *)
Capacitor, Ceramic (MLCC), 22pF, ±5%, 50V, NP0, ±5%, SMD 0402; Manufacturer: YAGEO; Manufacturer Part Number: AC0402JRNPO9BN220; Package Size: 0402; JLCPCB Basic Part: No; JLCPCB Part Number: C726125; Supplier 1: LCSC; Category: Capacitors - MLCC; Supplier Part Number 1: C726125; Tolerance: ±5%; Voltage Rating: 50V; Temperature Coefficient: NP0; RoHS: Yes; ComponentLink1Description: Datasheet; ComponentLink1URL: https://wmsc.lcsc.com/wmsc/upload/file/pdf/v2/lcsc/2009191609_YAGEO-AC0402JRNPO9BN220_C726125.pdf; ComponentLink2Description: JLCPCB Part URL; ComponentLink2URL: https://jlcpcb.com/partdetail/C726125; ComponentLink3Description: LCSC Part URL; ComponentLink3URL: https://lcsc.com/product-detail/Multilayer-Ceramic-Capacitors-MLCC---SMD-SMT_YAGEO-YAGEO-AC0402JRNPO9BN220_C726125.html
footprint CAP-0402 (0402 (1005M) Capacitor)
pins: 1, 2

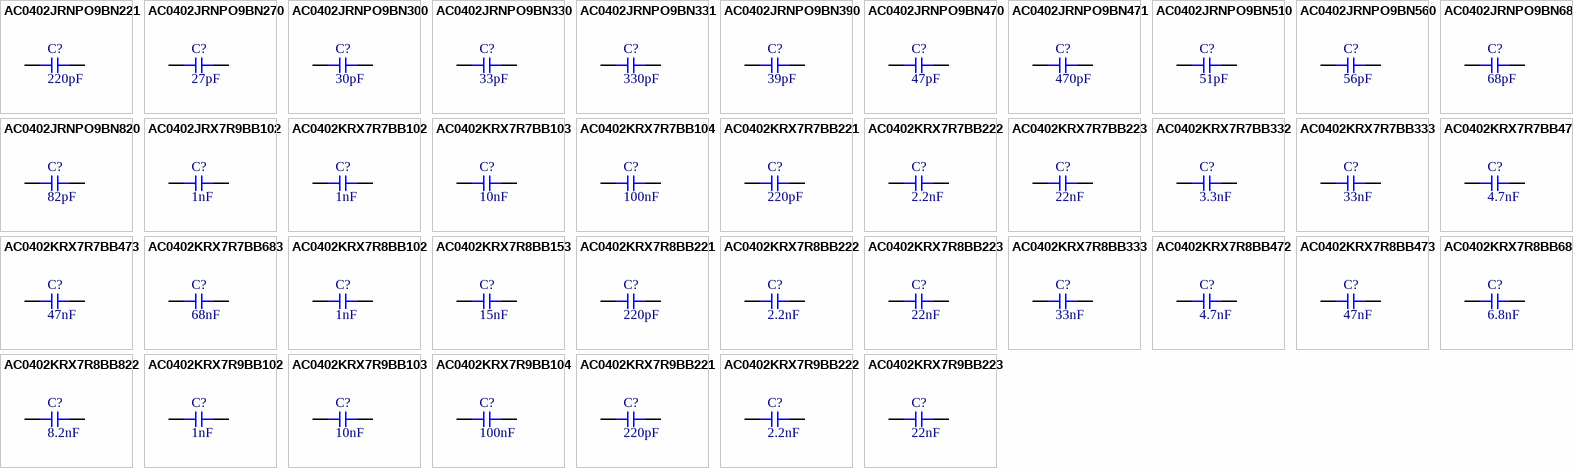
[diagram p18: symbols AC0402JRNPO9BN221 to AC0402KRX7R9BB223]

## AC0402JRNPO9BN221
designator C?  Capacitance: 220pF  (hidden comment: *)
Capacitor, Ceramic (MLCC), 220pF, ±5%, 50V, NP0, ±5%, SMD 0402; Manufacturer: YAGEO; Manufacturer Part Number: AC0402JRNPO9BN221; Package Size: 0402; JLCPCB Basic Part: No; JLCPCB Part Number: C309126; Supplier 1: LCSC; Category: Capacitors - MLCC; Supplier Part Number 1: C309126; Tolerance: ±5%; Voltage Rating: 50V; Temperature Coefficient: NP0; RoHS: Yes; ComponentLink1Description: Datasheet; ComponentLink1URL: https://wmsc.lcsc.com/wmsc/upload/file/pdf/v2/lcsc/2304140030_YAGEO-AC0402JRNPO9BN221_C309126.pdf; ComponentLink2Description: JLCPCB Part URL; ComponentLink2URL: https://jlcpcb.com/partdetail/C309126; ComponentLink3Description: LCSC Part URL; ComponentLink3URL: https://lcsc.com/product-detail/Multilayer-Ceramic-Capacitors-MLCC---SMD-SMT_YAGEO-YAGEO-AC0402JRNPO9BN221_C309126.html
footprint CAP-0402 (0402 (1005M) Capacitor)
pins: 1, 2

## AC0402JRNPO9BN270
designator C?  Capacitance: 27pF  (hidden comment: *)
Capacitor, Ceramic (MLCC), 27pF, ±5%, 50V, NP0, ±5%, SMD 0402; Manufacturer: YAGEO; Manufacturer Part Number: AC0402JRNPO9BN270; Package Size: 0402; JLCPCB Basic Part: No; JLCPCB Part Number: C726126; Supplier 1: LCSC; Category: Capacitors - MLCC; Supplier Part Number 1: C726126; Tolerance: ±5%; Voltage Rating: 50V; Temperature Coefficient: NP0; RoHS: Yes; ComponentLink1Description: Datasheet; ComponentLink1URL: https://wmsc.lcsc.com/wmsc/upload/file/pdf/v2/lcsc/2009191609_YAGEO-AC0402JRNPO9BN270_C726126.pdf; ComponentLink2Description: JLCPCB Part URL; ComponentLink2URL: https://jlcpcb.com/partdetail/C726126; ComponentLink3Description: LCSC Part URL; ComponentLink3URL: https://lcsc.com/product-detail/Multilayer-Ceramic-Capacitors-MLCC---SMD-SMT_YAGEO-YAGEO-AC0402JRNPO9BN270_C726126.html
footprint CAP-0402 (0402 (1005M) Capacitor)
pins: 1, 2

## AC0402JRNPO9BN300
designator C?  Capacitance: 30pF  (hidden comment: *)
Capacitor, Ceramic (MLCC), 30pF, ±5%, 50V, NP0, ±5%, SMD 0402; Manufacturer: YAGEO; Manufacturer Part Number: AC0402JRNPO9BN300; Package Size: 0402; JLCPCB Basic Part: No; JLCPCB Part Number: C726127; Supplier 1: LCSC; Category: Capacitors - MLCC; Supplier Part Number 1: C726127; Tolerance: ±5%; Voltage Rating: 50V; Temperature Coefficient: NP0; RoHS: Yes; ComponentLink1Description: Datasheet; ComponentLink1URL: https://wmsc.lcsc.com/wmsc/upload/file/pdf/v2/lcsc/2009181006_YAGEO-AC0402JRNPO9BN300_C726127.pdf; ComponentLink2Description: JLCPCB Part URL; ComponentLink2URL: https://jlcpcb.com/partdetail/C726127; ComponentLink3Description: LCSC Part URL; ComponentLink3URL: https://lcsc.com/product-detail/Multilayer-Ceramic-Capacitors-MLCC---SMD-SMT_YAGEO-YAGEO-AC0402JRNPO9BN300_C726127.html
footprint CAP-0402 (0402 (1005M) Capacitor)
pins: 1, 2

## AC0402JRNPO9BN330
designator C?  Capacitance: 33pF  (hidden comment: *)
Capacitor, Ceramic (MLCC), 33pF, ±5%, 50V, NP0, ±5%, SMD 0402; Manufacturer: YAGEO; Manufacturer Part Number: AC0402JRNPO9BN330; Package Size: 0402; JLCPCB Basic Part: No; JLCPCB Part Number: C309127; Supplier 1: LCSC; Category: Capacitors - MLCC; Supplier Part Number 1: C309127; Tolerance: ±5%; Voltage Rating: 50V; Temperature Coefficient: NP0; RoHS: Yes; ComponentLink1Description: Datasheet; ComponentLink1URL: https://wmsc.lcsc.com/wmsc/upload/file/pdf/v2/lcsc/2304140030_YAGEO-AC0402JRNPO9BN330_C309127.pdf; ComponentLink2Description: JLCPCB Part URL; ComponentLink2URL: https://jlcpcb.com/partdetail/C309127; ComponentLink3Description: LCSC Part URL; ComponentLink3URL: https://lcsc.com/product-detail/Multilayer-Ceramic-Capacitors-MLCC---SMD-SMT_YAGEO-YAGEO-AC0402JRNPO9BN330_C309127.html
footprint CAP-0402 (0402 (1005M) Capacitor)
pins: 1, 2

## AC0402JRNPO9BN331
designator C?  Capacitance: 330pF  (hidden comment: *)
Capacitor, Ceramic (MLCC), 330pF, ±5%, 50V, NP0, ±5%, SMD 0402; Manufacturer: YAGEO; Manufacturer Part Number: AC0402JRNPO9BN331; Package Size: 0402; JLCPCB Basic Part: No; JLCPCB Part Number: C726128; Supplier 1: LCSC; Category: Capacitors - MLCC; Supplier Part Number 1: C726128; Tolerance: ±5%; Voltage Rating: 50V; Temperature Coefficient: NP0; RoHS: Yes; ComponentLink1Description: Datasheet; ComponentLink1URL: https://wmsc.lcsc.com/wmsc/upload/file/pdf/v2/lcsc/2009181006_YAGEO-AC0402JRNPO9BN331_C726128.pdf; ComponentLink2Description: JLCPCB Part URL; ComponentLink2URL: https://jlcpcb.com/partdetail/C726128; ComponentLink3Description: LCSC Part URL; ComponentLink3URL: https://lcsc.com/product-detail/Multilayer-Ceramic-Capacitors-MLCC---SMD-SMT_YAGEO-YAGEO-AC0402JRNPO9BN331_C726128.html
footprint CAP-0402 (0402 (1005M) Capacitor)
pins: 1, 2

## AC0402JRNPO9BN390
designator C?  Capacitance: 39pF  (hidden comment: *)
Capacitor, Ceramic (MLCC), 39pF, ±5%, 50V, NP0, ±5%, SMD 0402; Manufacturer: YAGEO; Manufacturer Part Number: AC0402JRNPO9BN390; Package Size: 0402; JLCPCB Basic Part: No; JLCPCB Part Number: C726129; Supplier 1: LCSC; Category: Capacitors - MLCC; Supplier Part Number 1: C726129; Tolerance: ±5%; Voltage Rating: 50V; Temperature Coefficient: NP0; RoHS: Yes; ComponentLink1Description: Datasheet; ComponentLink1URL: https://wmsc.lcsc.com/wmsc/upload/file/pdf/v2/lcsc/2009191609_YAGEO-AC0402JRNPO9BN390_C726129.pdf; ComponentLink2Description: JLCPCB Part URL; ComponentLink2URL: https://jlcpcb.com/partdetail/C726129; ComponentLink3Description: LCSC Part URL; ComponentLink3URL: https://lcsc.com/product-detail/Multilayer-Ceramic-Capacitors-MLCC---SMD-SMT_YAGEO-YAGEO-AC0402JRNPO9BN390_C726129.html
footprint CAP-0402 (0402 (1005M) Capacitor)
pins: 1, 2

## AC0402JRNPO9BN470
designator C?  Capacitance: 47pF  (hidden comment: *)
Capacitor, Ceramic (MLCC), 47pF, ±5%, 50V, NP0, ±5%, SMD 0402; Manufacturer: YAGEO; Manufacturer Part Number: AC0402JRNPO9BN470; Package Size: 0402; JLCPCB Basic Part: No; JLCPCB Part Number: C605203; Supplier 1: LCSC; Category: Capacitors - MLCC; Supplier Part Number 1: C605203; Tolerance: ±5%; Voltage Rating: 50V; Temperature Coefficient: NP0; RoHS: Yes; ComponentLink1Description: Datasheet; ComponentLink1URL: https://wmsc.lcsc.com/wmsc/upload/file/pdf/v2/lcsc/2304140030_YAGEO-AC0402JRNPO9BN470_C605203.pdf; ComponentLink2Description: JLCPCB Part URL; ComponentLink2URL: https://jlcpcb.com/partdetail/C605203; ComponentLink3Description: LCSC Part URL; ComponentLink3URL: https://lcsc.com/product-detail/Multilayer-Ceramic-Capacitors-MLCC---SMD-SMT_YAGEO-YAGEO-AC0402JRNPO9BN470_C605203.html
footprint CAP-0402 (0402 (1005M) Capacitor)
pins: 1, 2

## AC0402JRNPO9BN471
designator C?  Capacitance: 470pF  (hidden comment: *)
Capacitor, Ceramic (MLCC), 470pF, ±5%, 50V, ±5%, SMD 0402; Manufacturer: YAGEO; Manufacturer Part Number: AC0402JRNPO9BN471; Package Size: 0402; JLCPCB Basic Part: No; JLCPCB Part Number: C726130; Supplier 1: LCSC; Category: Capacitors - MLCC; Supplier Part Number 1: C726130; Tolerance: ±5%; Voltage Rating: 50V; RoHS: Yes; ComponentLink1Description: Datasheet; ComponentLink1URL: https://wmsc.lcsc.com/wmsc/upload/file/pdf/v2/lcsc/2012141239_YAGEO-AC0402JRNPO9BN471_C726130.pdf; ComponentLink2Description: JLCPCB Part URL; ComponentLink2URL: https://jlcpcb.com/partdetail/C726130; ComponentLink3Description: LCSC Part URL; ComponentLink3URL: https://lcsc.com/product-detail/Multilayer-Ceramic-Capacitors-MLCC---SMD-SMT_YAGEO-YAGEO-AC0402JRNPO9BN471_C726130.html
footprint CAP-0402 (0402 (1005M) Capacitor)
pins: 1, 2

## AC0402JRNPO9BN510
designator C?  Capacitance: 51pF  (hidden comment: *)
Capacitor, Ceramic (MLCC), 51pF, ±5%, 50V, NP0, ±5%, SMD 0402; Manufacturer: YAGEO; Manufacturer Part Number: AC0402JRNPO9BN510; Package Size: 0402; JLCPCB Basic Part: No; JLCPCB Part Number: C2176869; Supplier 1: LCSC; Category: Capacitors - MLCC; Supplier Part Number 1: C2176869; Tolerance: ±5%; Voltage Rating: 50V; Temperature Coefficient: NP0; RoHS: Yes; ComponentLink1Description: Datasheet; ComponentLink1URL: https://wmsc.lcsc.com/wmsc/upload/file/pdf/v2/lcsc/2202040830_YAGEO-AC0402JRNPO9BN510_C2176869.pdf; ComponentLink2Description: JLCPCB Part URL; ComponentLink2URL: https://jlcpcb.com/partdetail/C2176869; ComponentLink3Description: LCSC Part URL; ComponentLink3URL: https://lcsc.com/product-detail/Multilayer-Ceramic-Capacitors-MLCC---SMD-SMT_YAGEO-YAGEO-AC0402JRNPO9BN510_C2176869.html
footprint CAP-0402 (0402 (1005M) Capacitor)
pins: 1, 2

## AC0402JRNPO9BN560
designator C?  Capacitance: 56pF  (hidden comment: *)
Capacitor, Ceramic (MLCC), 56pF, ±5%, 50V, NP0, ±5%, SMD 0402; Manufacturer: YAGEO; Manufacturer Part Number: AC0402JRNPO9BN560; Package Size: 0402; JLCPCB Basic Part: No; JLCPCB Part Number: C726131; Supplier 1: LCSC; Category: Capacitors - MLCC; Supplier Part Number 1: C726131; Tolerance: ±5%; Voltage Rating: 50V; Temperature Coefficient: NP0; RoHS: Yes; ComponentLink1Description: Datasheet; ComponentLink1URL: https://wmsc.lcsc.com/wmsc/upload/file/pdf/v2/lcsc/2009191609_YAGEO-AC0402JRNPO9BN560_C726131.pdf; ComponentLink2Description: JLCPCB Part URL; ComponentLink2URL: https://jlcpcb.com/partdetail/C726131; ComponentLink3Description: LCSC Part URL; ComponentLink3URL: https://lcsc.com/product-detail/Multilayer-Ceramic-Capacitors-MLCC---SMD-SMT_YAGEO-YAGEO-AC0402JRNPO9BN560_C726131.html
footprint CAP-0402 (0402 (1005M) Capacitor)
pins: 1, 2

## AC0402JRNPO9BN680
designator C?  Capacitance: 68pF  (hidden comment: *)
Capacitor, Ceramic (MLCC), 68pF, ±5%, 50V, NP0, ±5%, SMD 0402; Manufacturer: YAGEO; Manufacturer Part Number: AC0402JRNPO9BN680; Package Size: 0402; JLCPCB Basic Part: No; JLCPCB Part Number: C723416; Supplier 1: LCSC; Category: Capacitors - MLCC; Supplier Part Number 1: C723416; Tolerance: ±5%; Voltage Rating: 50V; Temperature Coefficient: NP0; RoHS: Yes; ComponentLink1Description: Datasheet; ComponentLink1URL: https://wmsc.lcsc.com/wmsc/upload/file/pdf/v2/lcsc/2008171812_YAGEO-AC0402JRNPO9BN680_C723416.pdf; ComponentLink2Description: JLCPCB Part URL; ComponentLink2URL: https://jlcpcb.com/partdetail/C723416; ComponentLink3Description: LCSC Part URL; ComponentLink3URL: https://lcsc.com/product-detail/Multilayer-Ceramic-Capacitors-MLCC---SMD-SMT_YAGEO-YAGEO-AC0402JRNPO9BN680_C723416.html
footprint CAP-0402 (0402 (1005M) Capacitor)
pins: 1, 2

## AC0402JRNPO9BN820
designator C?  Capacitance: 82pF  (hidden comment: *)
Capacitor, Ceramic (MLCC), 82pF, ±5%, 50V, NP0, ±5%, SMD 0402; Manufacturer: YAGEO; Manufacturer Part Number: AC0402JRNPO9BN820; Package Size: 0402; JLCPCB Basic Part: No; JLCPCB Part Number: C605204; Supplier 1: LCSC; Category: Capacitors - MLCC; Supplier Part Number 1: C605204; Tolerance: ±5%; Voltage Rating: 50V; Temperature Coefficient: NP0; RoHS: Yes; ComponentLink1Description: Datasheet; ComponentLink1URL: https://wmsc.lcsc.com/wmsc/upload/file/pdf/v2/lcsc/2304140030_YAGEO-AC0402JRNPO9BN820_C605204.pdf; ComponentLink2Description: JLCPCB Part URL; ComponentLink2URL: https://jlcpcb.com/partdetail/C605204; ComponentLink3Description: LCSC Part URL; ComponentLink3URL: https://lcsc.com/product-detail/Multilayer-Ceramic-Capacitors-MLCC---SMD-SMT_YAGEO-YAGEO-AC0402JRNPO9BN820_C605204.html
footprint CAP-0402 (0402 (1005M) Capacitor)
pins: 1, 2

## AC0402JRX7R9BB102
designator C?  Capacitance: 1nF  (hidden comment: *)
Capacitor, Ceramic (MLCC), 1nF, ±5%, 50V, X7R, ±5%, SMD 0402; Manufacturer: YAGEO; Manufacturer Part Number: AC0402JRX7R9BB102; Package Size: 0402; JLCPCB Basic Part: No; JLCPCB Part Number: C726132; Supplier 1: LCSC; Category: Capacitors - MLCC; Supplier Part Number 1: C726132; Tolerance: ±5%; Voltage Rating: 50V; Temperature Coefficient: X7R; RoHS: Yes; ComponentLink1Description: Datasheet; ComponentLink1URL: https://wmsc.lcsc.com/wmsc/upload/file/pdf/v2/lcsc/2012141239_YAGEO-AC0402JRX7R9BB102_C726132.pdf; ComponentLink2Description: JLCPCB Part URL; ComponentLink2URL: https://jlcpcb.com/partdetail/C726132; ComponentLink3Description: LCSC Part URL; ComponentLink3URL: https://lcsc.com/product-detail/Multilayer-Ceramic-Capacitors-MLCC---SMD-SMT_YAGEO-YAGEO-AC0402JRX7R9BB102_C726132.html
footprint CAP-0402 (0402 (1005M) Capacitor)
pins: 1, 2

## AC0402KRX7R7BB102
designator C?  Capacitance: 1nF  (hidden comment: *)
Capacitor, Ceramic (MLCC), 1nF, ±10%, 16V, X7R, ±10%, SMD 0402; Manufacturer: YAGEO; Manufacturer Part Number: AC0402KRX7R7BB102; Package Size: 0402; JLCPCB Basic Part: No; JLCPCB Part Number: C726514; Supplier 1: LCSC; Category: Capacitors - MLCC; Supplier Part Number 1: C726514; Tolerance: ±10%; Voltage Rating: 16V; Temperature Coefficient: X7R; RoHS: Yes; ComponentLink1Description: Datasheet; ComponentLink1URL: https://wmsc.lcsc.com/wmsc/upload/file/pdf/v2/lcsc/2010041434_YAGEO-AC0402KRX7R7BB102_C726514.pdf; ComponentLink2Description: JLCPCB Part URL; ComponentLink2URL: https://jlcpcb.com/partdetail/C726514; ComponentLink3Description: LCSC Part URL; ComponentLink3URL: https://lcsc.com/product-detail/Multilayer-Ceramic-Capacitors-MLCC---SMD-SMT_YAGEO-YAGEO-AC0402KRX7R7BB102_C726514.html
footprint CAP-0402 (0402 (1005M) Capacitor)
pins: 1, 2

## AC0402KRX7R7BB103
designator C?  Capacitance: 10nF  (hidden comment: *)
Capacitor, Ceramic (MLCC), 10nF, ±10%, 16V, X7R, ±10%, SMD 0402; Manufacturer: YAGEO; Manufacturer Part Number: AC0402KRX7R7BB103; Package Size: 0402; JLCPCB Basic Part: No; JLCPCB Part Number: C726515; Supplier 1: LCSC; Category: Capacitors - MLCC; Supplier Part Number 1: C726515; Tolerance: ±10%; Voltage Rating: 16V; Temperature Coefficient: X7R; RoHS: Yes; ComponentLink1Description: Datasheet; ComponentLink1URL: https://wmsc.lcsc.com/wmsc/upload/file/pdf/v2/lcsc/2105241335_YAGEO-AC0402KRX7R7BB103_C726515.pdf; ComponentLink2Description: JLCPCB Part URL; ComponentLink2URL: https://jlcpcb.com/partdetail/C726515; ComponentLink3Description: LCSC Part URL; ComponentLink3URL: https://lcsc.com/product-detail/Multilayer-Ceramic-Capacitors-MLCC---SMD-SMT_YAGEO-YAGEO-AC0402KRX7R7BB103_C726515.html
footprint CAP-0402 (0402 (1005M) Capacitor)
pins: 1, 2

## AC0402KRX7R7BB104
designator C?  Capacitance: 100nF  (hidden comment: *)
Capacitor, Ceramic (MLCC), 100nF, ±10%, 16V, X7R, ±10%, SMD 0402; Manufacturer: YAGEO; Manufacturer Part Number: AC0402KRX7R7BB104; Package Size: 0402; JLCPCB Basic Part: No; JLCPCB Part Number: C272879; Supplier 1: LCSC; Category: Capacitors - MLCC; Supplier Part Number 1: C272879; Tolerance: ±10%; Voltage Rating: 16V; Temperature Coefficient: X7R; RoHS: Yes; ComponentLink1Description: Datasheet; ComponentLink1URL: https://wmsc.lcsc.com/wmsc/upload/file/pdf/v2/lcsc/1912111437_YAGEO-AC0402KRX7R7BB104_C272879.pdf; ComponentLink2Description: JLCPCB Part URL; ComponentLink2URL: https://jlcpcb.com/partdetail/C272879; ComponentLink3Description: LCSC Part URL; ComponentLink3URL: https://lcsc.com/product-detail/Multilayer-Ceramic-Capacitors-MLCC---SMD-SMT_YAGEO-YAGEO-AC0402KRX7R7BB104_C272879.html
footprint CAP-0402 (0402 (1005M) Capacitor)
pins: 1, 2

## AC0402KRX7R7BB221
designator C?  Capacitance: 220pF  (hidden comment: *)
Capacitor, Ceramic (MLCC), 220pF, ±10%, 16V, X7R, ±10%, SMD 0402; Manufacturer: YAGEO; Manufacturer Part Number: AC0402KRX7R7BB221; Package Size: 0402; JLCPCB Basic Part: No; JLCPCB Part Number: C2180486; Supplier 1: LCSC; Category: Capacitors - MLCC; Supplier Part Number 1: C2180486; Tolerance: ±10%; Voltage Rating: 16V; Temperature Coefficient: X7R; RoHS: Yes; ComponentLink1Description: Datasheet; ComponentLink1URL: https://wmsc.lcsc.com/wmsc/upload/file/pdf/v2/lcsc/2202041130_YAGEO-AC0402KRX7R7BB221_C2180486.pdf; ComponentLink2Description: JLCPCB Part URL; ComponentLink2URL: https://jlcpcb.com/partdetail/C2180486; ComponentLink3Description: LCSC Part URL; ComponentLink3URL: https://lcsc.com/product-detail/Multilayer-Ceramic-Capacitors-MLCC---SMD-SMT_YAGEO-YAGEO-AC0402KRX7R7BB221_C2180486.html
footprint CAP-0402 (0402 (1005M) Capacitor)
pins: 1, 2